# Altium footprint library WeldBlock.PcbLib: 12 footprints
Each footprint in its own frame and in the unit in brackets; x right, y up, seen from the top. Pads: shape width x height; smd on the part's side, far side on the other; paste and mask are expansions set on the pad; w line width, h text height; cw(c..) or ccw(c..) is an arc to the next point about the centre after c.
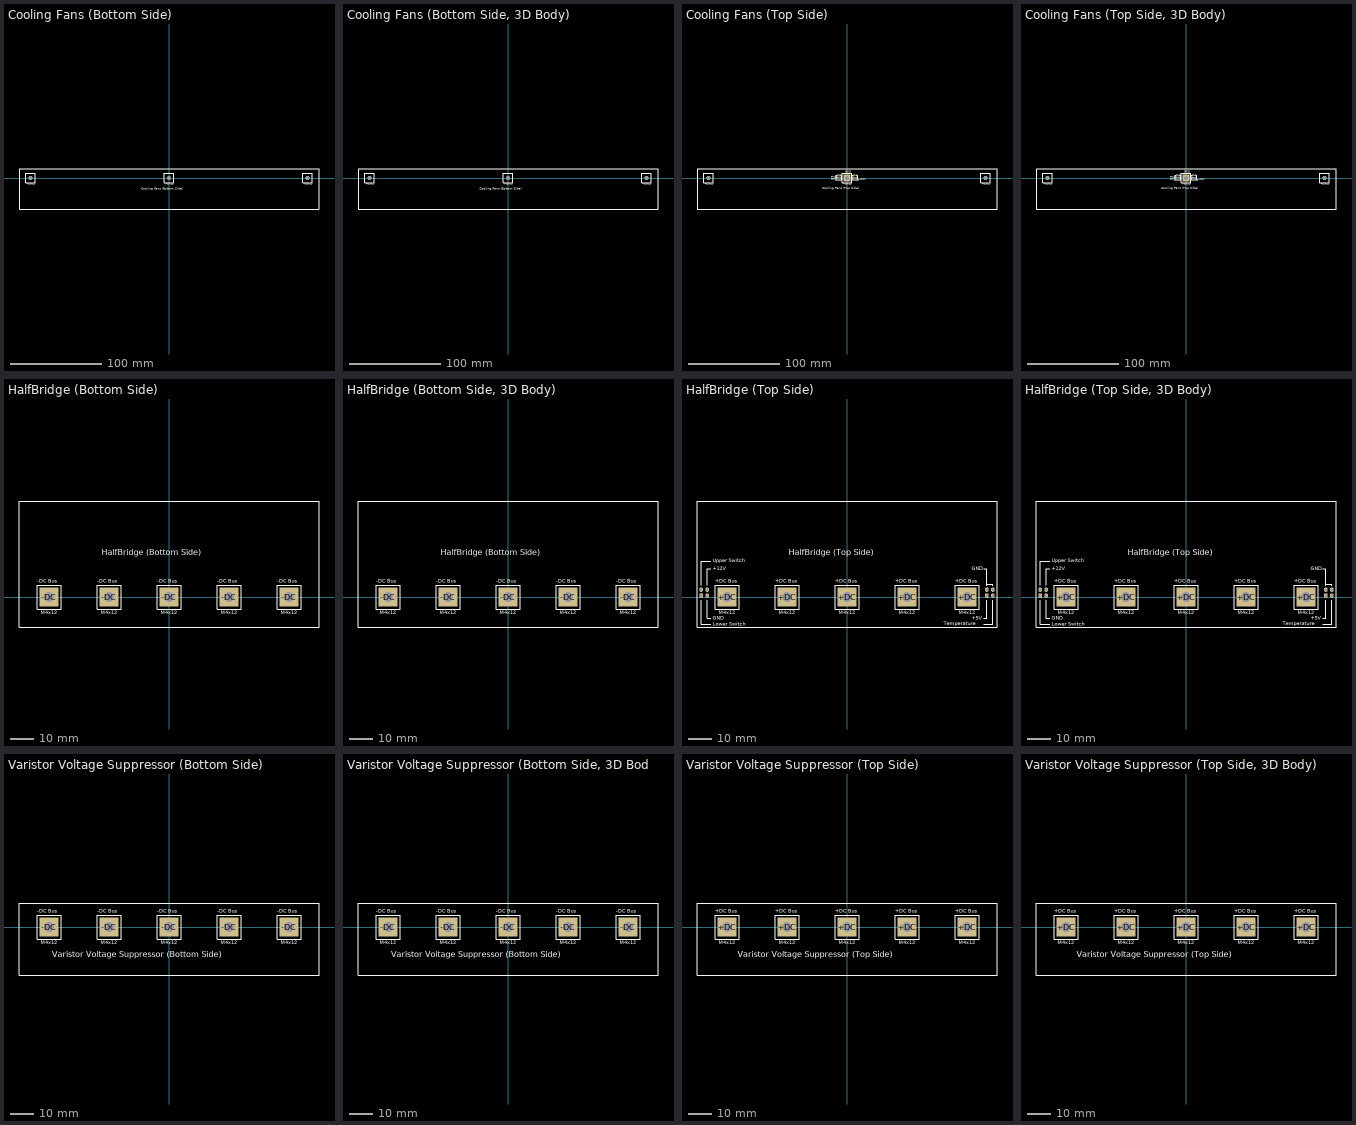
[diagram p0: the footprints below, top view; thin cyan lines are the x and y axes]

## Cooling Fans (Bottom Side) [mil] "Cooling Module with 2 Fans (120X120X38mm)"
pads (3):
  round 170 hole 170 unplated: ""(-6000,0) ""(0,0) ""(6000,0)
Top Overlay:
  lines w10: -6500,-1350 -6500,400 6500,400 6500,-1350 -6500,-1350 ; -6200,-200 -5800,-200 -5800,200 -6200,200 -6200,-200 ; -200,-200 -200,200 200,200 200,-200 -200,-200 ; 5800,-200 5800,200 6200,200 6200,-200 5800,-200
  text "M4x12" at -135,-290 h60
  text "Cooling Fans (Bottom Side)" at -1200,-500 h100
  text "M4x12" at 5865,-290 h60
  text "M4x12" at -6135,-290 h60
Bottom Overlay:
  lines w10: -6500,-1350 6500,-1350 6500,400 -6500,400 -6500,-1350 ; -6200,-200 -6200,200 -5800,200 -5800,-200 -6200,-200 ; -200,-200 200,-200 200,200 -200,200 -200,-200 ; 5800,-200 6200,-200 6200,200 5800,200 5800,-200
  text "M4x12" at 140,-290 h60
  text "M4x12" at -5860,-290 h60
  text "M4x12" at 6140,-290 h60
  text "Cooling Fans (Bottom Side)" at 1225,-500 h100
3D body: height 354.33, standoff -196.85, extent 1000,1700 1000,1700
3D body: height 354.33, standoff -196.85, extent 1000,1700 1000,1700

## Cooling Fans (Bottom Side, 3D Body) [mil] "Cooling Module with 2 Fans (120X120X38mm)"
pads (3):
  round 170 hole 170 unplated: ""(-6000,0) ""(0,0) ""(6000,0)
Top Overlay:
  lines w10: -6500,-1350 6500,-1350 6500,400 -6500,400 -6500,-1350 ; -6200,-200 -6200,200 -5800,200 -5800,-200 -6200,-200 ; -200,-200 200,-200 200,200 -200,200 -200,-200 ; 5800,-200 6200,-200 6200,200 5800,200 5800,-200
  text "M4x12" at -6135,-290 h60
  text "M4x12" at 5865,-290 h60
  text "Cooling Fans (Bottom Side)" at -1225,-500 h100
  text "M4x12" at -135,-290 h60
Bottom Overlay:
  lines w10: -6500,-1350 -6500,400 6500,400 6500,-1350 -6500,-1350 ; -6200,-200 -5800,-200 -5800,200 -6200,200 -6200,-200 ; -200,-200 -200,200 200,200 200,-200 -200,-200 ; 5800,-200 5800,200 6200,200 6200,-200 5800,-200
  text "Cooling Fans (Bottom Side)" at 1225,-500 h100
  text "M4x12" at 6140,-290 h60
  text "M4x12" at -5860,-290 h60
  text "M4x12" at 140,-290 h60
3D body: height 354.33, standoff -196.85, extent 1000,1700 1000,1700
3D body: height 354.33, standoff -196.85, extent 1000,1700 1000,1700
3D body "FANBoard.step": height 5100, standoff 0, extent -6500,-1324.06 6500.04,372

## Cooling Fans (Top Side) [mil] "Cooling Module with 2 Fans (120X120X38mm)"
pads (11):
  rrect50% 60x75 hole 40: +12V(300,22) PWM(-400,22)
  oval 60x75 hole 40: +12V(300,122) +12V(400,22) +12V(400,122) GND(-300,22) GND(-300,122) PWM(-400,122)
  rrect5% 315x315 hole 170: GND(0,0)
  round 170 hole 170 unplated: ""(-6000,0) ""(6000,0)
Top Overlay:
  lines w10: -500,-75 -225,-75 -225,122 -250,122 ; -500,22 -475,22 ; -450,22 -475,22 ; -450,122 -475,122 -475,22 ; -250,22 -225,22 ; 225,22 250,22 ; 250,122 225,122 225,-75 500,-75 ; 450,22 475,22 ; 450,122 475,122 475,-75 ; -6500,-1350 6500,-1350 6500,400 -6500,400 -6500,-1350 ; -6200,-200 -5800,-200 -5800,200 -6200,200 -6200,-200 ; -200,-200 -200,200 200,200 200,-200 -200,-200 ; 5800,-200 5800,200 6200,200 6200,-200 5800,-200
  text "GND" at -680,-105 h60
  text "PWM" at -680,-5 h60
  text "+12V" at 525,-100 h60
  text "M4x12" at 5865,-290 h60
  text "M4x12" at -135,-290 h60
  text "M4x12" at -6135,-290 h60
  text "GND" at -80,235 h60
  text "Cooling Fans (Top Side)" at -1075,-475 h100
Bottom Overlay:
  lines w10: -500,-75 -225,-75 -225,122 -250,122 ; -500,22 -475,22 ; -450,22 -475,22 ; -450,122 -475,122 -475,22 ; -250,22 -225,22 ; 225,22 250,22 ; 250,122 225,122 225,-75 500,-75 ; 450,22 475,22 ; 450,122 475,122 475,-75 ; -6500,-1350 -6500,400 6500,400 6500,-1350 -6500,-1350 ; -6200,-200 -5800,-200 -5800,200 -6200,200 -6200,-200 ; -200,-200 -200,200 200,200 200,-200 -200,-200 ; 5800,-200 5800,200 6200,200 6200,-200 5800,-200
  text "GND" at 80,235 h60
  text "M4x12" at 140,-290 h60
  text "M4x12" at 6140,-290 h60
  text "M4x12" at -5860,-290 h60
  text "Cooling Fans (Top Side)" at 1075,-475 h100
  text "PWM" at -520,-5 h60
  text "+12V" at 725,-100 h60
  text "GND" at -520,-105 h60
3D body: height 354.33, standoff -196.85, extent 1000,1700 1000,1700
3D body "DS-1023-04.STEP": height 334.65, standoff -118.11, extent 250,-26.43 450,170.42
3D body "DS-1023-04.STEP": height 334.65, standoff -118.11, extent -450,-26.42 -250,170.43

## Cooling Fans (Top Side, 3D Body) [mil] "Cooling Module with 2 Fans (120X120X38mm)"
pads (11):
  rrect50% 60x75 hole 40: +12V(300,22) PWM(-400,22)
  oval 60x75 hole 40: +12V(300,122) +12V(400,22) +12V(400,122) GND(-300,22) GND(-300,122) PWM(-400,122)
  rrect5% 315x315 hole 170: GND(0,0)
  round 170 hole 170 unplated: ""(-6000,0) ""(6000,0)
Top Overlay:
  lines w10: -500,-75 -225,-75 -225,122 -250,122 ; -500,22 -475,22 ; -450,22 -475,22 ; -450,122 -475,122 -475,22 ; -250,22 -225,22 ; 225,22 250,22 ; 250,122 225,122 225,-75 500,-75 ; 450,22 475,22 ; 450,122 475,122 475,-75 ; -6500,-1350 6500,-1350 6500,400 -6500,400 -6500,-1350 ; -6200,-200 -5800,-200 -5800,200 -6200,200 -6200,-200 ; -200,-200 -200,200 200,200 200,-200 -200,-200 ; 5800,-200 5800,200 6200,200 6200,-200 5800,-200
  text "GND" at -680,-105 h60
  text "PWM" at -680,-5 h60
  text "+12V" at 525,-100 h60
  text "M4x12" at 5865,-290 h60
  text "M4x12" at -135,-290 h60
  text "M4x12" at -6135,-290 h60
  text "GND" at -80,235 h60
  text "Cooling Fans (Top Side)" at -1075,-475 h100
Bottom Overlay:
  lines w10: -500,-75 -225,-75 -225,122 -250,122 ; -500,22 -475,22 ; -450,22 -475,22 ; -450,122 -475,122 -475,22 ; -250,22 -225,22 ; 225,22 250,22 ; 250,122 225,122 225,-75 500,-75 ; 450,22 475,22 ; 450,122 475,122 475,-75 ; -6500,-1350 -6500,400 6500,400 6500,-1350 -6500,-1350 ; -6200,-200 -5800,-200 -5800,200 -6200,200 -6200,-200 ; -200,-200 -200,200 200,200 200,-200 -200,-200 ; 5800,-200 5800,200 6200,200 6200,-200 5800,-200
  text "GND" at 80,235 h60
  text "M4x12" at 140,-290 h60
  text "M4x12" at 6140,-290 h60
  text "M4x12" at -5860,-290 h60
  text "Cooling Fans (Top Side)" at 1075,-475 h100
  text "PWM" at -520,-5 h60
  text "+12V" at 725,-100 h60
  text "GND" at -520,-105 h60
3D body: height 354.33, standoff -196.85, extent 1000,1700 1000,1700
3D body "DS-1023-04.STEP": height 334.65, standoff -118.11, extent 250,-26.43 450,170.42
3D body "DS-1023-04.STEP": height 334.65, standoff -118.11, extent -450,-26.42 -250,170.43
3D body "FANBoard.step": height 5100, standoff 0, extent -6500,-1324.07 6500.04,372

## HalfBridge (Bottom Side) [mil] "HalfBridge module  ( 200A at Symmetrical Square AC)"
pads (5):
  rrect5% 315x315 hole 170: -DC(-2000,0) -DC(-1000,0) -DC(0,0) -DC(1000,0) -DC(2000,0)
Top Overlay:
  lines w10: -2500,-500 2500,-500 2500,1600 -2500,1600 -2500,-500 ; -2200,-200 -1800,-200 -1800,200 -2200,200 -2200,-200 ; -1200,-200 -1200,200 -800,200 -800,-200 -1200,-200 ; -200,-200 -200,200 200,200 200,-200 -200,-200 ; 800,-200 800,200 1200,200 1200,-200 800,-200 ; 1800,-200 1800,200 2200,200 2200,-200 1800,-200
  text "M4x12" at 1865,-290 h60
  text "M4x12" at 865,-290 h60
  text "M4x12" at -135,-290 h60
  text "M4x12" at -1135,-290 h60
  text "M4x12" at -2135,-290 h60
  text "-DC Bus" at -2200,235 h60
  text "-DC Bus" at -1200,235 h60
  text "-DC Bus" at -200,235 h60
  text "-DC Bus" at 800,235 h60
  text "-DC Bus" at 1800,235 h60
  text "HalfBridge (Bottom Side)" at -1125,700 h100
Bottom Overlay:
  lines w10: -2500,-500 -2500,1600 2500,1600 2500,-500 -2500,-500 ; -2200,-200 -1800,-200 -1800,200 -2200,200 -2200,-200 ; -1200,-200 -1200,200 -800,200 -800,-200 -1200,-200 ; -200,-200 -200,200 200,200 200,-200 -200,-200 ; 800,-200 800,200 1200,200 1200,-200 800,-200 ; 1800,-200 1800,200 2200,200 2200,-200 1800,-200
  text "-DC Bus" at 200,235 h60
  text "-DC Bus" at -800,235 h60
  text "M4x12" at 140,-290 h60
  text "-DC Bus" at 2200,235 h60
  text "M4x12" at 2140,-290 h60
  text "-DC Bus" at 1200,235 h60
  text "M4x12" at 1140,-290 h60
  text "M4x12" at -860,-290 h60
  text "-DC Bus" at -1800,235 h60
  text "M4x12" at -1860,-290 h60
  text "HalfBridge (Bottom Side)" at 1100,700 h100
3D body: height 354.33, standoff -196.85, extent 1000,1700 1000,1700
3D body: height 354.33, standoff -196.85, extent 1000,1700 1000,1700

## HalfBridge (Bottom Side, 3D Body) [mil] "HalfBridge module  ( 200A at Symmetrical Square AC)"
pads (5):
  rrect5% 315x315 hole 170: -DC(-2000,0) -DC(-1000,0) -DC(0,0) -DC(1000,0) -DC(2000,0)
Top Overlay:
  lines w10: -2500,-500 -2500,1600 2500,1600 2500,-500 -2500,-500 ; -2200,-200 -2200,200 -1800,200 -1800,-200 -2200,-200 ; -1200,-200 -800,-200 -800,200 -1200,200 -1200,-200 ; -200,-200 200,-200 200,200 -200,200 -200,-200 ; 800,-200 1200,-200 1200,200 800,200 800,-200 ; 1800,-200 2200,-200 2200,200 1800,200 1800,-200
  text "HalfBridge (Bottom Side)" at -1125,700 h100
  text "-DC Bus" at 1800,235 h60
  text "-DC Bus" at 800,235 h60
  text "-DC Bus" at -200,235 h60
  text "-DC Bus" at -1200,235 h60
  text "-DC Bus" at -2200,235 h60
  text "M4x12" at -2135,-290 h60
  text "M4x12" at -1135,-290 h60
  text "M4x12" at -135,-290 h60
  text "M4x12" at 865,-290 h60
  text "M4x12" at 1865,-290 h60
Bottom Overlay:
  lines w10: -2500,-500 2500,-500 2500,1600 -2500,1600 -2500,-500 ; -2200,-200 -2200,200 -1800,200 -1800,-200 -2200,-200 ; -1200,-200 -800,-200 -800,200 -1200,200 -1200,-200 ; -200,-200 200,-200 200,200 -200,200 -200,-200 ; 800,-200 1200,-200 1200,200 800,200 800,-200 ; 1800,-200 2200,-200 2200,200 1800,200 1800,-200
  text "HalfBridge (Bottom Side)" at 1100,700 h100
  text "M4x12" at -1860,-290 h60
  text "-DC Bus" at -1800,235 h60
  text "M4x12" at -860,-290 h60
  text "M4x12" at 1140,-290 h60
  text "-DC Bus" at 1200,235 h60
  text "M4x12" at 2140,-290 h60
  text "-DC Bus" at 2200,235 h60
  text "M4x12" at 140,-290 h60
  text "-DC Bus" at -800,235 h60
  text "-DC Bus" at 200,235 h60
3D body: height 354.33, standoff -196.85, extent 1000,1700 1000,1700
3D body: height 354.33, standoff -196.85, extent 1000,1700 1000,1700
3D body "DCtoAC.step": height 5100, standoff 0, extent -2500,-499.29 2500,1537.81

## HalfBridge (Top Side) [mil] "HalfBridge module  ( 200A at Symmetrical Square AC)"
pads (13):
  rrect50% 60x75 hole 40: +5V(2330,22) "Lower Switch"(-2430,22)
  oval 60x75 hole 40: +12V(-2330,122) "GND Switch"(-2330,22) "GND Temperature"(2330,122) "GND Temperature"(2430,122) Temperature(2430,22) "Upper Switch"(-2430,122)
  rrect5% 315x315 hole 170: +DC(-2000,0) +DC(-1000,0) +DC(0,0) +DC(1000,0) +DC(2000,0)
Top Overlay:
  lines w10: -2430,-50 -2430,-450 -2275,-450 ; -2430,200 -2430,600 -2275,600 ; -2330,-50 -2330,-350 -2275,-350 ; -2330,200 -2330,475 -2275,475 ; 2275,-450 2430,-450 2430,-50 ; 2275,-350 2330,-350 2330,-50 ; 2275,475 2330,475 2330,215 ; 2330,190 2330,215 ; 2430,190 2430,215 2330,215 ; -2500,-500 -2500,1600 2500,1600 2500,-500 -2500,-500 ; -2200,-200 -2200,200 -1800,200 -1800,-200 -2200,-200 ; -1200,-200 -800,-200 -800,200 -1200,200 -1200,-200 ; -200,-200 200,-200 200,200 -200,200 -200,-200 ; 800,-200 1200,-200 1200,200 800,200 800,-200 ; 1800,-200 2200,-200 2200,200 1800,200 1800,-200
  text "GND" at 2080,445 h60
  text "Upper Switch" at -2240,580 h60
  text "+12V" at -2240,445 h60
  text "HalfBridge (Top Side)" at -975,700 h100
  text "+DC Bus" at 1800,235 h60
  text "+DC Bus" at 800,235 h60
  text "+DC Bus" at -200,235 h60
  text "+DC Bus" at -1200,235 h60
  text "+DC Bus" at -2200,235 h60
  text "M4x12" at -2135,-290 h60
  text "M4x12" at -1135,-290 h60
  text "M4x12" at -135,-290 h60
  text "M4x12" at 865,-290 h60
  text "M4x12" at 1865,-290 h60
  text "Lower Switch" at -2240,-480 h60
  text "GND" at -2240,-380 h60
  text "Temperature" at 1610,-470 h60
  text "+5V" at 2080,-380 h60
Bottom Overlay:
  lines w10: -2430,-50 -2430,-450 -2275,-450 ; -2430,200 -2430,600 -2275,600 ; -2330,-50 -2330,-350 -2275,-350 ; -2330,200 -2330,475 -2275,475 ; -2255,244 -2230,244 ; 2275,-450 2430,-450 2430,-50 ; 2275,-350 2330,-350 2330,-50 ; 2275,475 2330,475 2330,215 ; 2330,190 2330,215 ; 2430,190 2430,215 2330,215 ; -2500,-500 2500,-500 2500,1600 -2500,1600 -2500,-500 ; -2200,-200 -2200,200 -1800,200 -1800,-200 -2200,-200 ; -1200,-200 -800,-200 -800,200 -1200,200 -1200,-200 ; -200,-200 200,-200 200,200 -200,200 -200,-200 ; 800,-200 1200,-200 1200,200 800,200 800,-200 ; 1800,-200 2200,-200 2200,200 1800,200 1800,-200
  text "GND" at 2240,447 h60
  text "+12V" at -2030,445 h60
  text "Upper Switch" at -1560,580 h60
  text "HalfBridge (Top Side)" at 975,700 h100
  text "M4x12" at -1860,-290 h60
  text "-DC Bus" at -1800,235 h60
  text "M4x12" at -860,-290 h60
  text "M4x12" at 1140,-290 h60
  text "-DC Bus" at 1200,235 h60
  text "M4x12" at 2140,-290 h60
  text "-DC Bus" at 2200,235 h60
  text "M4x12" at 140,-290 h60
  text "-DC Bus" at -800,235 h60
  text "-DC Bus" at 200,235 h60
  text "Lower Switch" at -1560,-480 h60
  text "GND" at -2080,-380 h60
  text "Temperature" at 2240,-468 h60
  text "+5V" at 2240,-383 h60
3D body: height 354.33, standoff -196.85, extent 1000,1700 1000,1700
3D body "DS-1023-04.STEP": height 334.65, standoff -118.11, extent -2480,-26.42 -2280,170.43
3D body "DS-1023-04.STEP": height 334.65, standoff -118.11, extent 2280,-26.43 2480,170.42

## HalfBridge (Top Side, 3D Body) [mil] "HalfBridge module  ( 200A at Symmetrical Square AC)"
pads (13):
  rrect50% 60x75 hole 40: +5V(2330,22) "Lower Switch"(-2430,22)
  oval 60x75 hole 40: +12V(-2330,122) "GND Switch"(-2330,22) "GND Temperature"(2330,122) "GND Temperature"(2430,122) Temperature(2430,22) "Upper Switch"(-2430,122)
  rrect5% 315x315 hole 170: +DC(-2000,0) +DC(-1000,0) +DC(0,0) +DC(1000,0) +DC(2000,0)
Top Overlay:
  lines w10: -2430,-50 -2430,-450 -2275,-450 ; -2430,200 -2430,600 -2275,600 ; -2330,-50 -2330,-350 -2275,-350 ; -2330,200 -2330,475 -2275,475 ; 2275,-450 2430,-450 2430,-50 ; 2275,-350 2330,-350 2330,-50 ; 2275,475 2330,475 2330,215 ; 2330,190 2330,215 ; 2430,190 2430,215 2330,215 ; -2500,-500 -2500,1600 2500,1600 2500,-500 -2500,-500 ; -2200,-200 -2200,200 -1800,200 -1800,-200 -2200,-200 ; -1200,-200 -800,-200 -800,200 -1200,200 -1200,-200 ; -200,-200 200,-200 200,200 -200,200 -200,-200 ; 800,-200 1200,-200 1200,200 800,200 800,-200 ; 1800,-200 2200,-200 2200,200 1800,200 1800,-200
  text "HalfBridge (Top Side)" at -975,700 h100
  text "+DC Bus" at 1800,235 h60
  text "+DC Bus" at 800,235 h60
  text "+DC Bus" at -200,235 h60
  text "+DC Bus" at -1200,235 h60
  text "+DC Bus" at -2200,235 h60
  text "M4x12" at -2135,-290 h60
  text "M4x12" at -1135,-290 h60
  text "M4x12" at -135,-290 h60
  text "M4x12" at 865,-290 h60
  text "M4x12" at 1865,-290 h60
  text "Temperature" at 1610,-470 h60
  text "+5V" at 2080,-380 h60
  text "GND" at 2080,445 h60
  text "Lower Switch" at -2240,-480 h60
  text "Upper Switch" at -2240,580 h60
  text "+12V" at -2240,445 h60
  text "GND" at -2240,-380 h60
Bottom Overlay:
  lines w10: -2430,-50 -2430,-450 -2275,-450 ; -2430,200 -2430,600 -2275,600 ; -2330,-50 -2330,-350 -2275,-350 ; -2330,200 -2330,475 -2275,475 ; -2255,244 -2230,244 ; 2275,-450 2430,-450 2430,-50 ; 2275,-350 2330,-350 2330,-50 ; 2275,475 2330,475 2330,215 ; 2330,190 2330,215 ; 2430,190 2430,215 2330,215 ; -2500,-500 2500,-500 2500,1600 -2500,1600 -2500,-500 ; -2200,-200 -2200,200 -1800,200 -1800,-200 -2200,-200 ; -1200,-200 -800,-200 -800,200 -1200,200 -1200,-200 ; -200,-200 200,-200 200,200 -200,200 -200,-200 ; 800,-200 1200,-200 1200,200 800,200 800,-200 ; 1800,-200 2200,-200 2200,200 1800,200 1800,-200
  text "GND" at 2240,447 h60
  text "Temperature" at 2240,-468 h60
  text "+5V" at 2240,-383 h60
  text "HalfBridge (Top Side)" at 975,700 h100
  text "M4x12" at -1860,-290 h60
  text "-DC Bus" at -1800,235 h60
  text "M4x12" at -860,-290 h60
  text "M4x12" at 1140,-290 h60
  text "-DC Bus" at 1200,235 h60
  text "M4x12" at 2140,-290 h60
  text "-DC Bus" at 2200,235 h60
  text "M4x12" at 140,-290 h60
  text "-DC Bus" at -800,235 h60
  text "-DC Bus" at 200,235 h60
  text "Lower Switch" at -1560,-480 h60
  text "GND" at -2080,-380 h60
  text "+12V" at -2030,445 h60
  text "Upper Switch" at -1560,580 h60
3D body: height 354.33, standoff -196.85, extent 1000,1700 1000,1700
3D body "DCtoAC.step": height 5100, standoff 0, extent -2500,-499.3 2500,1537.81
3D body "DS-1023-04.STEP": height 334.65, standoff -118.11, extent -2480,-26.42 -2280,170.43
3D body "DS-1023-04.STEP": height 334.65, standoff -118.11, extent 2280,-26.43 2480,170.42

## Varistor Voltage Suppressor (Bottom Side) [mil] "Varistor Voltage Suppressor"
pads (5):
  rrect5% 315x315 hole 170: -DC(-2000,0) -DC(-1000,0) -DC(0,0) -DC(1000,0) -DC(2000,0)
Top Overlay:
  lines w10: -2500,-800 -2500,400 2500,400 2500,-800 -2500,-800 ; -2200,-200 -1800,-200 -1800,200 -2200,200 -2200,-200 ; -1200,-200 -1200,200 -800,200 -800,-200 -1200,-200 ; -200,-200 -200,200 200,200 200,-200 -200,-200 ; 800,-200 800,200 1200,200 1200,-200 800,-200 ; 1800,-200 1800,200 2200,200 2200,-200 1800,-200
  text "Varistor Voltage Suppressor (Bottom Side)" at -1950,-500 h100
  text "M4x12" at 1865,-290 h60
  text "M4x12" at 865,-290 h60
  text "M4x12" at -135,-290 h60
  text "M4x12" at -1135,-290 h60
  text "M4x12" at -2135,-290 h60
  text "-DC Bus" at -1200,235 h60
  text "-DC Bus" at -200,235 h60
  text "-DC Bus" at 1800,235 h60
  text "-DC Bus" at 800,235 h60
  text "-DC Bus" at -2200,235 h60
Bottom Overlay:
  lines w10: -2500,-800 2500,-800 2500,400 -2500,400 -2500,-800 ; -2200,-200 -2200,200 -1800,200 -1800,-200 -2200,-200 ; -1200,-200 -800,-200 -800,200 -1200,200 -1200,-200 ; -200,-200 200,-200 200,200 -200,200 -200,-200 ; 800,-200 1200,-200 1200,200 800,200 800,-200 ; 1800,-200 2200,-200 2200,200 1800,200 1800,-200
  text "M4x12" at -1860,-290 h60
  text "-DC Bus" at -1800,235 h60
  text "M4x12" at -860,-290 h60
  text "M4x12" at 1140,-290 h60
  text "-DC Bus" at 1200,235 h60
  text "M4x12" at 2140,-290 h60
  text "-DC Bus" at 2200,235 h60
  text "Varistor Voltage Suppressor (Bottom Side)" at 1950,-500 h100
  text "M4x12" at 140,-290 h60
  text "-DC Bus" at -800,235 h60
  text "-DC Bus" at 200,235 h60
3D body: height 354.33, standoff -196.85, extent 1000,1700 1000,1700
3D body: height 354.33, standoff -196.85, extent 1000,1700 1000,1700

## Varistor Voltage Suppressor (Bottom Side, 3D Body) [mil] "Varistor Voltage Suppressor"
pads (5):
  rrect5% 315x315 hole 170: -DC(-2000,0) -DC(-1000,0) -DC(0,0) -DC(1000,0) -DC(2000,0)
Top Overlay:
  lines w10: -2500,-800 -2500,400 2500,400 2500,-800 -2500,-800 ; -2200,-200 -1800,-200 -1800,200 -2200,200 -2200,-200 ; -1200,-200 -1200,200 -800,200 -800,-200 -1200,-200 ; -200,-200 -200,200 200,200 200,-200 -200,-200 ; 800,-200 800,200 1200,200 1200,-200 800,-200 ; 1800,-200 1800,200 2200,200 2200,-200 1800,-200
  text "Varistor Voltage Suppressor (Bottom Side)" at -1950,-500 h100
  text "M4x12" at 1865,-290 h60
  text "M4x12" at 865,-290 h60
  text "M4x12" at -135,-290 h60
  text "M4x12" at -1135,-290 h60
  text "M4x12" at -2135,-290 h60
  text "-DC Bus" at -1200,235 h60
  text "-DC Bus" at -200,235 h60
  text "-DC Bus" at 1800,235 h60
  text "-DC Bus" at 800,235 h60
  text "-DC Bus" at -2200,235 h60
Bottom Overlay:
  lines w10: -2500,-800 2500,-800 2500,400 -2500,400 -2500,-800 ; -2200,-200 -2200,200 -1800,200 -1800,-200 -2200,-200 ; -1200,-200 -800,-200 -800,200 -1200,200 -1200,-200 ; -200,-200 200,-200 200,200 -200,200 -200,-200 ; 800,-200 1200,-200 1200,200 800,200 800,-200 ; 1800,-200 2200,-200 2200,200 1800,200 1800,-200
  text "M4x12" at -1860,-290 h60
  text "-DC Bus" at -1800,235 h60
  text "M4x12" at -860,-290 h60
  text "M4x12" at 1140,-290 h60
  text "-DC Bus" at 1200,235 h60
  text "M4x12" at 2140,-290 h60
  text "-DC Bus" at 2200,235 h60
  text "Varistor Voltage Suppressor (Bottom Side)" at 1950,-500 h100
  text "M4x12" at 140,-290 h60
  text "-DC Bus" at -800,235 h60
  text "-DC Bus" at 200,235 h60
3D body: height 354.33, standoff -196.85, extent 1000,1700 1000,1700
3D body: height 354.33, standoff -196.85, extent 1000,1700 1000,1700
3D body "VaristorBoard.step": height 5100, standoff 0, extent -2500,-707.6 2500,372

## Varistor Voltage Suppressor (Top Side) [mil] "VVaristor Voltage Suppressor"
pads (5):
  rrect5% 315x315 hole 170: +DC(-2000,0) +DC(-1000,0) +DC(0,0) +DC(1000,0) +DC(2000,0)
Top Overlay:
  lines w10: -2500,-800 2500,-800 2500,400 -2500,400 -2500,-800 ; -2200,-200 -2200,200 -1800,200 -1800,-200 -2200,-200 ; -1200,-200 -800,-200 -800,200 -1200,200 -1200,-200 ; -200,-200 200,-200 200,200 -200,200 -200,-200 ; 800,-200 1200,-200 1200,200 800,200 800,-200 ; 1800,-200 2200,-200 2200,200 1800,200 1800,-200
  text "+DC Bus" at -2200,235 h60
  text "+DC Bus" at 800,235 h60
  text "+DC Bus" at 1800,235 h60
  text "+DC Bus" at -200,235 h60
  text "+DC Bus" at -1200,235 h60
  text "M4x12" at -2135,-290 h60
  text "M4x12" at -1135,-290 h60
  text "M4x12" at -135,-290 h60
  text "M4x12" at 865,-290 h60
  text "M4x12" at 1865,-290 h60
  text "Varistor Voltage Suppressor (Top Side)" at -1825,-500 h100
Bottom Overlay:
  lines w10: -2500,-800 -2500,400 2500,400 2500,-800 -2500,-800 ; -2200,-200 -1800,-200 -1800,200 -2200,200 -2200,-200 ; -1200,-200 -1200,200 -800,200 -800,-200 -1200,-200 ; -200,-200 -200,200 200,200 200,-200 -200,-200 ; 800,-200 800,200 1200,200 1200,-200 800,-200 ; 1800,-200 1800,200 2200,200 2200,-200 1800,-200
  text "+DC Bus" at 200,235 h60
  text "+DC Bus" at -800,235 h60
  text "M4x12" at 140,-290 h60
  text "Varistor Voltage Suppressor (Top Side)" at 1825,-500 h100
  text "+DC Bus" at 2200,235 h60
  text "M4x12" at 2140,-290 h60
  text "+DC Bus" at 1200,235 h60
  text "M4x12" at 1140,-290 h60
  text "M4x12" at -860,-290 h60
  text "+DC Bus" at -1800,235 h60
  text "M4x12" at -1860,-290 h60
3D body: height 354.33, standoff -196.85, extent 1000,1700 1000,1700

## Varistor Voltage Suppressor (Top Side, 3D Body) [mil] "Varistor Voltage Suppressor"
pads (5):
  rrect5% 315x315 hole 170: +DC(-2000,0) +DC(-1000,0) +DC(0,0) +DC(1000,0) +DC(2000,0)
Top Overlay:
  lines w10: -2500,-800 2500,-800 2500,400 -2500,400 -2500,-800 ; -2200,-200 -2200,200 -1800,200 -1800,-200 -2200,-200 ; -1200,-200 -800,-200 -800,200 -1200,200 -1200,-200 ; -200,-200 200,-200 200,200 -200,200 -200,-200 ; 800,-200 1200,-200 1200,200 800,200 800,-200 ; 1800,-200 2200,-200 2200,200 1800,200 1800,-200
  text "+DC Bus" at -2200,235 h60
  text "+DC Bus" at 800,235 h60
  text "+DC Bus" at 1800,235 h60
  text "+DC Bus" at -200,235 h60
  text "+DC Bus" at -1200,235 h60
  text "M4x12" at -2135,-290 h60
  text "M4x12" at -1135,-290 h60
  text "M4x12" at -135,-290 h60
  text "M4x12" at 865,-290 h60
  text "M4x12" at 1865,-290 h60
  text "Varistor Voltage Suppressor (Top Side)" at -1825,-500 h100
Bottom Overlay:
  lines w10: -2500,-800 -2500,400 2500,400 2500,-800 -2500,-800 ; -2200,-200 -1800,-200 -1800,200 -2200,200 -2200,-200 ; -1200,-200 -1200,200 -800,200 -800,-200 -1200,-200 ; -200,-200 -200,200 200,200 200,-200 -200,-200 ; 800,-200 800,200 1200,200 1200,-200 800,-200 ; 1800,-200 1800,200 2200,200 2200,-200 1800,-200
  text "+DC Bus" at 200,235 h60
  text "+DC Bus" at -800,235 h60
  text "M4x12" at 140,-290 h60
  text "Varistor Voltage Suppressor (Top Side)" at 1825,-500 h100
  text "+DC Bus" at 2200,235 h60
  text "M4x12" at 2140,-290 h60
  text "+DC Bus" at 1200,235 h60
  text "M4x12" at 1140,-290 h60
  text "M4x12" at -860,-290 h60
  text "+DC Bus" at -1800,235 h60
  text "M4x12" at -1860,-290 h60
3D body: height 354.33, standoff -196.85, extent 1000,1700 1000,1700
3D body "VaristorBoard.step": height 5100, standoff 0, extent -2500,-707.61 2500,372